# Altium footprint library SWLIB(150721).PcbLib: 348 footprints (part 18 of 22)
Each footprint in its own frame and in the unit in brackets; x right, y up, seen from the top. Pads: shape width x height; smd on the part's side, far side on the other; paste and mask are expansions set on the pad; w line width, h text height; cw(c..) or ccw(c..) is an arc to the next point about the centre after c.
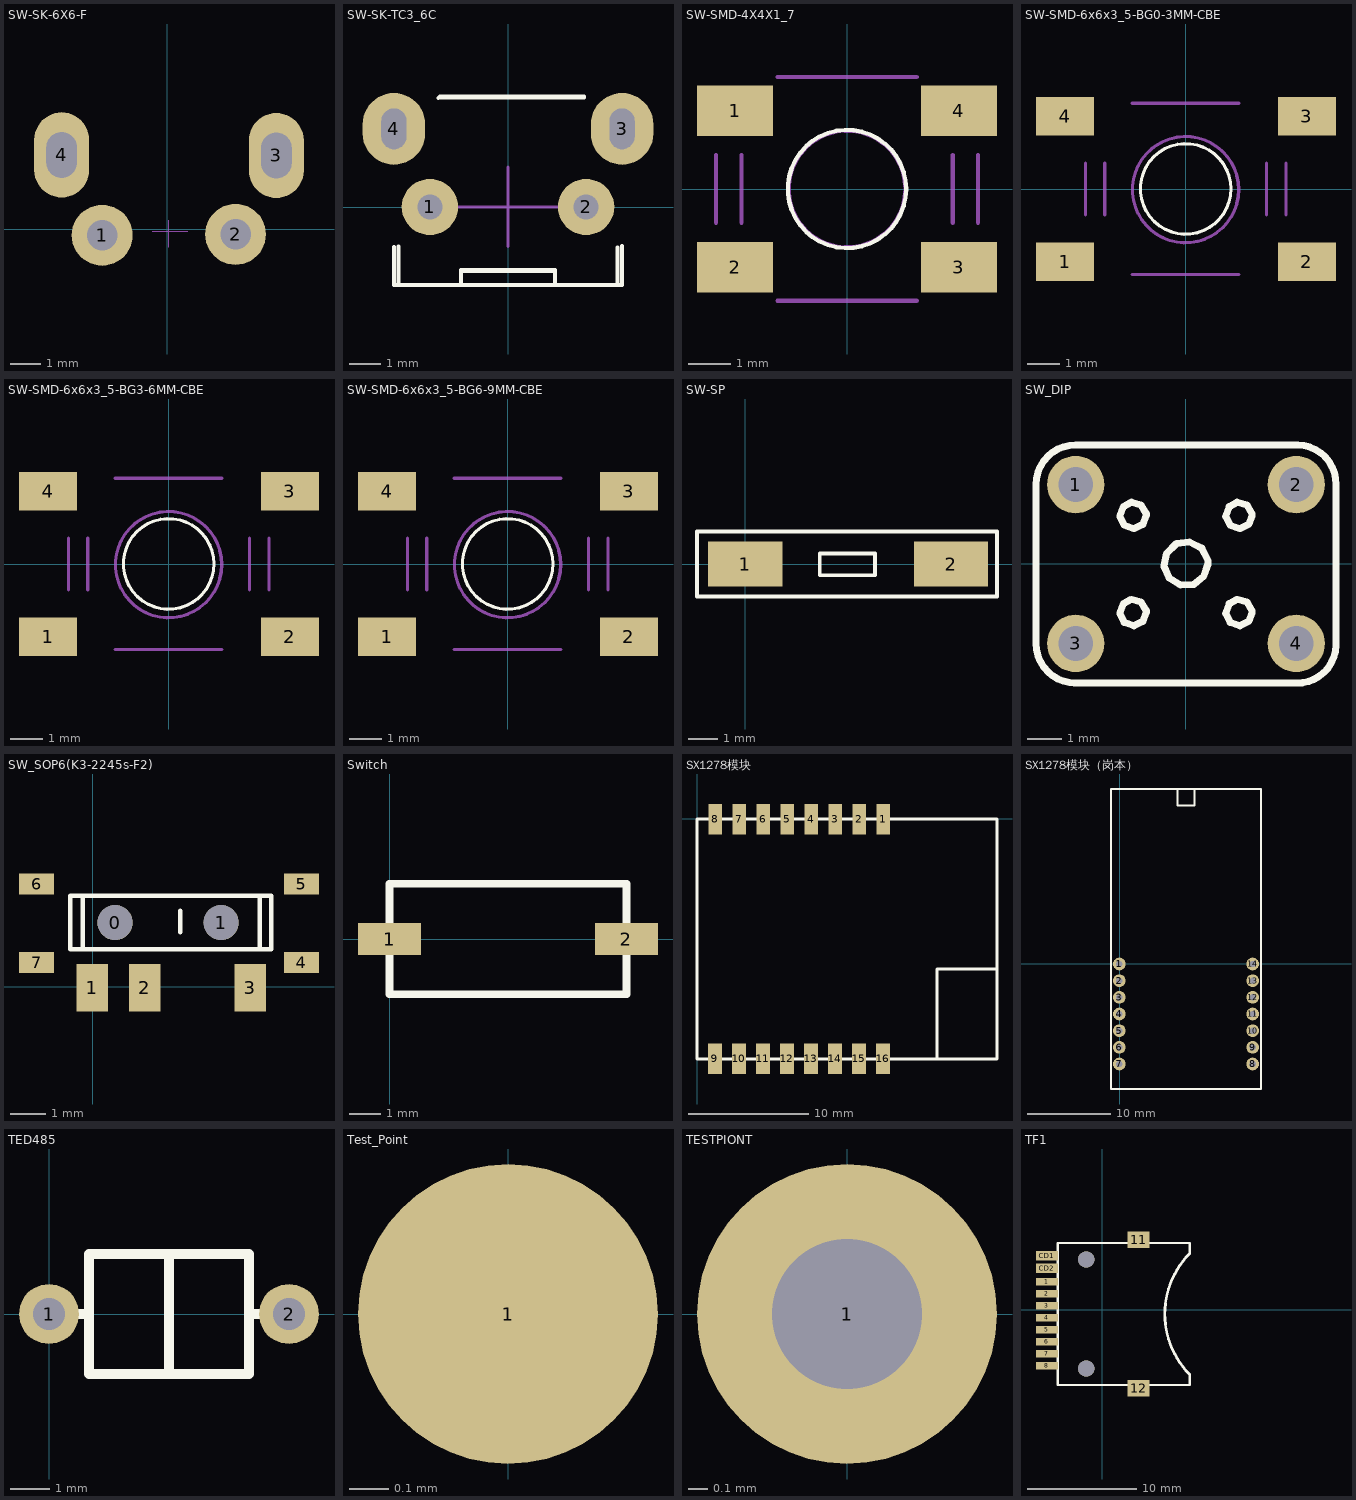
[diagram p17: the footprints below, top view; thin cyan lines are the x and y axes]

## SW-SK-6X6-F [mm]
pads (4):
  round 2 hole 1 mask+0: 1(-2.14,-0.2) 2(2.24,-0.17)
  oval 1.8x2.8 hole 1 slot 1.5 at 90 deg mask+0: 3(3.58,2.42) 4(-3.47,2.44)
Keep-Out Layer:
  lines w0.1: -3.98,2.14 -3.98,2.67 ; -3.98,2.15 ccw(c-3.48,2.15) -2.98,2.15 ; -3.98,2.68 cw(c-3.48,2.68) -2.98,2.68 ; -2.98,2.13 -2.98,2.66 ; 3.08,2.16 3.08,2.69 ; 3.08,2.18 ccw(c3.58,2.18) 4.08,2.18 4.08,2.71 ; 3.09,2.68 cw(c3.59,2.68) 4.09,2.68
Mechanical 2:
  lines w0.01: -0.493,-0.065 -0.29,-0.065 0.543,-0.065 0.667,-0.065 ; 0.052,-0.594 0.052,0.29 ; -1.908,-0.315 -1.798,-0.315 ; -1.908,-0.315 -2.387,-0.315 -2.498,-0.315 -2.498,-0.065 -2.387,-0.065 -1.908,-0.065 ; -1.908,-0.315 -1.798,-0.315 ; -1.908,-0.065 -1.798,-0.065 ; -1.908,-0.065 -1.798,-0.065 ; -1.798,-0.315 -1.798,-0.065 ; -1.798,-0.315 -1.798,-0.065 ; -3.637,2.935 -3.611,1.935 -3.298,1.935 -3.315,2.935 -3.637,2.935 ; 1.902,-0.315 1.902,-0.065 2.013,-0.065 2.492,-0.065 2.602,-0.065 2.602,-0.315 2.492,-0.315 2.013,-0.315 1.902,-0.315 ; 3.402,1.935 3.42,2.935 3.742,2.935 3.716,1.935 3.402,1.935
3D body "SK-6XX6装配体2.STEP": height 7.37, standoff -3.5, extent -4.071,-4.16 4.291,3.81

## SW-SK-TC3_6C [mm]
pads (4):
  round 1.8 hole 0.8: 1(-2.5,0.004) 2(2.5,0.004)
  oval 2x2.3 hole 0.8 slot 1.3 at 90 deg: 3(3.65,2.504) 4(-3.65,2.504)
Top Overlay:
  lines w0.127: -3.65,-1.271 -3.65,-2.496 3.65,-2.496 3.65,-1.237 ; -3.5,-2.454 -3.5,-1.254 ; -2.232,3.489 2.427,3.51 ; -2.181,3.546 2.427,3.546 ; -1.5,-2.496 -1.5,-2.05 1.5,-2.05 1.5,-2.496 ; -1.5,-2.454 -1.5,-2.008 1.5,-2.008 1.5,-2.454 ; 3.5,-2.454 3.5,-1.288
Mechanical 5:
  lines w0.1: -2.5,0.004 2.5,0.004 ; 0,-1.261 0,1.274
3D body "TC-2X6-装配体1.STEP": height 4.4, standoff -2.6, extent -4.21,-4.254 4.29,3.446

## SW-SMD-4X4X1_7 [mm] "TD-13MA"
pads (4):
  rect 1.8x1.2 smd: 1(-2.65,1.85) 2(-2.65,-1.85) 3(2.65,-1.85) 4(2.65,1.85)
Top Overlay:
  circle w0.1: c0,0 r1.4
Mechanical 1:
  circle w0.1: c0,0 r1.382
Mechanical 2:
  lines w0.1: -3.097,-0.797 -3.097,0.803 ; -2.497,-0.797 -2.497,0.803 ; -1.648,-2.647 1.652,-2.647 ; -1.648,2.653 1.652,2.653 ; 2.503,-0.797 2.503,0.803 ; 3.103,-0.797 3.103,0.803
3D body "bing.STEP": height 2, standoff 0.5, extent -0.97,-0.98 0.99,0.98
3D body "SW-SMD-4X4X0_0装配体1.STEP": height 1.17, standoff -0.1, extent -3.175,-2.591 3.225,2.609

## SW-SMD-6x6x3_5-BG0-3MM-CBE [mm] "6X6X3.3 双击柄高加0MM"
pads (4):
  rect 1.8x1.2 smd: 1(-3.725,-2.25) 2(3.75,-2.25) 3(3.75,2.25) 4(-3.725,2.25)
Top Overlay:
  circle w0.1: c0.002,0.003 r1.4
Mechanical 2:
  circle w0.1: c0,-0.02 r1.642
  lines w0.1: -3.097,-0.797 -3.097,0.803 ; -2.497,-0.797 -2.497,0.803 ; -1.648,-2.647 1.652,-2.647 ; -1.648,2.653 1.652,2.653 ; 2.503,-0.797 2.503,0.803 ; 3.103,-0.797 3.103,0.803
3D body "BingGao0mm.STEP": height 6.3, standoff 3, extent -1.64,-1.67 1.66,1.63
3D body "SW-SMD-6X6X3_5Xbig0-CBE.STEP": height 3.8, standoff -0.03, extent -4.046,-3.03 4.158,3.07

## SW-SMD-6x6x3_5-BG3-6MM-CBE [mm] "6X6X3.3 双击柄高加3MM"
pads (4):
  rect 1.8x1.2 smd: 1(-3.725,-2.25) 2(3.75,-2.25) 3(3.75,2.25) 4(-3.725,2.25)
Top Overlay:
  circle w0.1: c0.002,0.003 r1.4
Mechanical 2:
  circle w0.1: c0,-0.02 r1.642
  lines w0.1: -3.097,-0.797 -3.097,0.803 ; -2.497,-0.797 -2.497,0.803 ; -1.648,-2.647 1.652,-2.647 ; -1.648,2.653 1.652,2.653 ; 2.503,-0.797 2.503,0.803 ; 3.103,-0.797 3.103,0.803
3D body "SW-SMD-6X6X3_5Xbig0-CBE.STEP": height 3.8, standoff -0.03, extent -4.046,-3.03 4.158,3.07
3D body "BingGao3mm.STEP": height 9.3, standoff 3, extent -1.64,-1.67 1.66,1.63

## SW-SMD-6x6x3_5-BG6-9MM-CBE [mm] "6X6X3.3 双击柄高加6MM"
pads (4):
  rect 1.8x1.2 smd: 1(-3.725,-2.25) 2(3.75,-2.25) 3(3.75,2.25) 4(-3.725,2.25)
Top Overlay:
  circle w0.1: c0.002,0.003 r1.4
Mechanical 2:
  circle w0.1: c0,-0.02 r1.642
  lines w0.1: -3.097,-0.797 -3.097,0.803 ; -2.497,-0.797 -2.497,0.803 ; -1.648,-2.647 1.652,-2.647 ; -1.648,2.653 1.652,2.653 ; 2.503,-0.797 2.503,0.803 ; 3.103,-0.797 3.103,0.803
3D body "BingGao6mm.STEP": height 9.3, standoff 3, extent -1.64,-1.67 1.66,1.63
3D body "SW-SMD-6X6X3_5Xbig0-CBE.STEP": height 3.8, standoff -0.03, extent -4.046,-3.03 4.158,3.07

## SW-SP [mm]
pads (2):
  rect 2.5x1.5 smd: 1(0,0) 2(6.934,0)
Top Overlay:
  lines w0.127: -1.626,-1.092 8.484,-1.092 8.484,1.092 -1.626,1.092 -1.626,-1.092 ; 2.515,-0.381 2.515,0.356 4.369,0.356 4.369,-0.381 2.515,-0.381

## SW_DIP [mil]
pads (4):
  round 65 hole 39.37: 1(-125,90) 2(125,90) 3(-125,-90) 4(125,-90)
Top Overlay:
  lines w8: -127,-135 -125,-135 ; -125,-135 cw(c-125,-90) -170,-90 -170,90 cw(c-125,90) -125,135 125,135 127,135 cw(c126,91) 170,90 170,-90 170,-92 cw(c126,-91) 125,-135 -125,-135 ; -75,-56 -70,-66 -59,-70 -49,-65 -45,-55 -45,-53 -51,-43 -62,-40 -71,-45 -75,-56 ; -75,54 -70,44 -59,40 -49,45 -45,55 -45,57 -51,67 -62,70 -71,65 -75,54 ; -25,-2 -19,-16 -6,-24 9,-23 20,-14 25,0 25,4 18,18 4,25 -11,23 -22,12 -25,-2 ; 45,-56 50,-66 61,-70 71,-65 75,-55 75,-53 69,-43 58,-40 49,-45 45,-56 ; 45,54 50,44 61,40 71,45 75,55 75,57 69,67 58,70 49,65 45,54
3D body: height 236.22, standoff 0, extent -58.18,-59.88 59.47,58
3D body: height 78.74, standoff 7.87, extent -125,-90 125,90
3D body: height 82.68, standoff 0, extent -82,52.14 -66.31,67.86
3D body: height 82.68, standoff 0, extent -82,-67.86 -66.31,-52.14
3D body: height 82.68, standoff 0, extent 67,-67.86 82.69,-52.14
3D body: height 82.68, standoff 0, extent 67,52.14 82.69,67.86

## SW_SOP6(K3-2245s-F2) [mm]
pads (9):
  round 1 hole 1: 0(0.635,1.829) 1(3.658,1.829)
  rect 0.9x1.35 smd: 1(-0.013,-0.025) 2(1.485,-0.025) 3(4.482,-0.025)
  rect 1x0.6 smd: 4(5.944,0.686) 5(5.944,2.921) 6(-1.6,2.921) 7(-1.6,0.686)
Top Overlay:
  lines w0.127: 2.489,1.549 2.489,1.575 2.489,2.159 ; -0.635,1.067 5.08,1.067 5.08,2.591 -0.635,2.591 -0.635,1.067 ; -0.279,1.067 4.75,1.067 4.75,2.591 -0.279,2.591 -0.279,1.067

## Switch [mil] "贴片按键"
pads (2):
  rect 80x40 smd: 1(0,0) 2(300,0)
Top Overlay:
  lines w10: 0,-20 0,-70 300,-70 300,-20 ; 0,20 0,70 300,70 300,20

## SX1278模块 [mm]
pads (16):
  rect 1.143x2.54 smd: 1(15.509,-0.008) 2(13.509,-0.008) 3(11.509,-0.008) 4(9.509,-0.008) 5(7.509,-0.008) 6(5.509,-0.008) 7(3.509,-0.008) 8(1.509,-0.008) 9(1.5,-20) 10(3.5,-20) 11(5.5,-20) 12(7.5,-20) 13(9.5,-20) 14(11.5,-20) 15(13.5,-20) 16(15.5,-20)
Top Overlay:
  lines w0.254: 20,-20 20,-15 20,-12.5 25,-12.5 ; 0,-20 25,-20 25,0 0,0 0,-10 0,-20

## SX1278模块（岗本） [mil]
pads (14):
  round 60 hole 30: 1(-1.3,-1.65) 2(-1.3,-80.39) 3(-1.3,-159.13) 4(-1.3,-237.87) 5(-1.3,-316.61) 6(-1.3,-395.35) 7(-1.3,-474.09) 8(628.62,-474.09) 9(628.62,-395.35) 10(628.62,-316.61) 11(628.62,-237.87) 12(628.62,-159.13) 13(628.62,-80.39) 14(628.62,-1.65)
Top Overlay:
  lines w10: 274.29,825.12 274.29,746.38 353.03,746.38 353.03,825.12 ; -40.67,-592.2 -40.67,825.12 667.99,825.12 667.99,-592.2 -40.67,-592.2

## TED485 [mil]
pads (2):
  round 60 hole 32: 1(0,0) 2(240,0)
Top Overlay:
  lines w10: 0,0 40,0 ; 120,-60 120,60 ; 200,0 240,0 ; 40,-60 60,-60 200,-60 200,60 40,60 40,-60

## Test_Point [mil]
pads (1):
  round 30 smd: 1(0,0)

## TESTPIONT [mil]
pads (1):
  round 60 hole 30: 1(0,0)

## TF1 [mm]
pads (14):
  rect 2x0.7 smd: 1(-5.08,2.538) 2(-5.08,1.438) 3(-5.08,0.338) 4(-5.08,-0.762) 5(-5.08,-1.862) 6(-5.08,-2.962) 7(-5.08,-4.062) 8(-5.08,-5.162)
  rect 2x1.5 smd: 11(3.32,6.408) 12(3.32,-7.232)
  rect 2x0.85 smd: CD1(-5.08,4.938) CD2(-5.08,3.788)
  round 1.5 hole 1.5 unplated: ""(-1.48,-5.412)
  round 1.5 hole 1.5: ""(-1.48,4.588)
Top Overlay:
  lines w0.2: 8.02,-5.962 8.02,-6.927 -4.08,-6.927 -4.08,6.103 8.02,6.103 8.02,5.138
  lines w0.254: 8.02,-5.962 cw(c13.57,-0.412) 8.02,5.138